# Altium footprint library Connector.PcbLib: 82 footprints (part 5 of 6)
Each footprint in its own frame and in the unit in brackets; x right, y up, seen from the top. Pads: shape width x height; smd on the part's side, far side on the other; paste and mask are expansions set on the pad; w line width, h text height; cw(c..) or ccw(c..) is an arc to the next point about the centre after c.
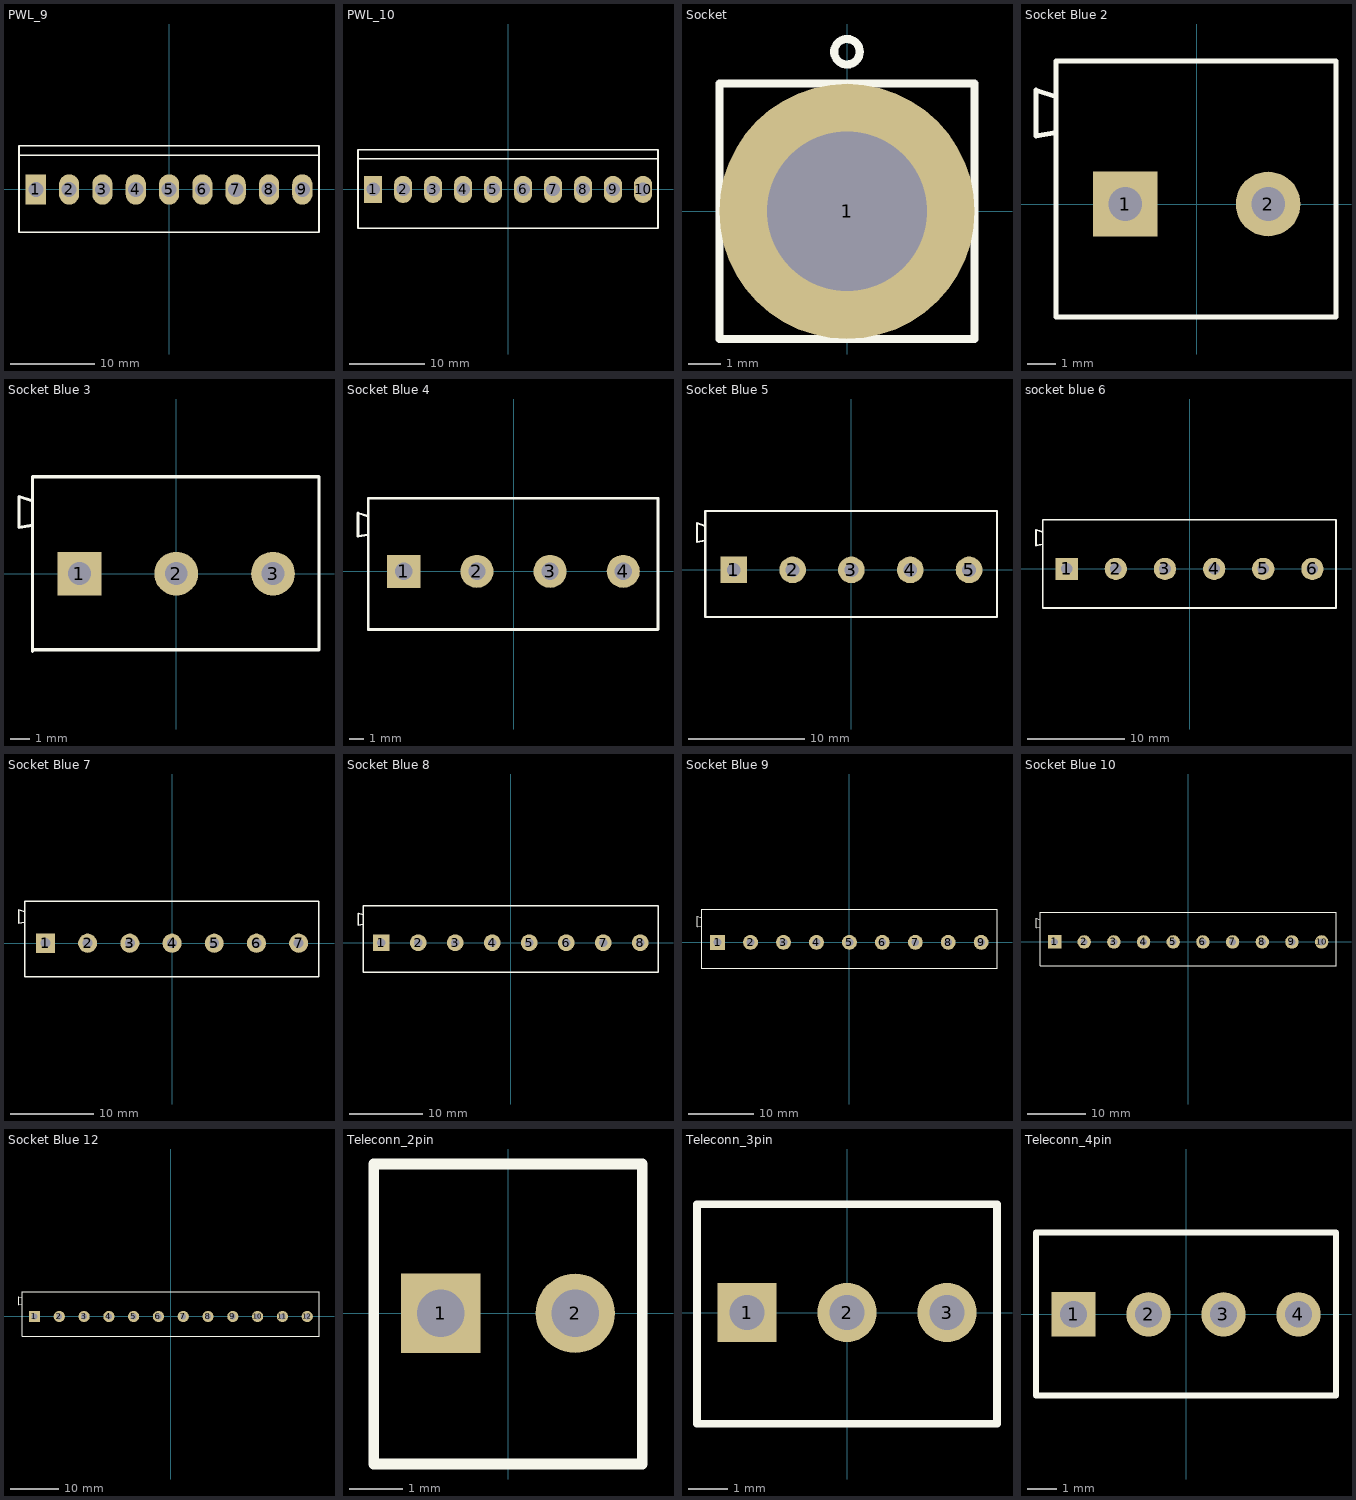
[diagram p4: the footprints below, top view; thin cyan lines are the x and y axes]

## PWL_9 [mm] "Connector; Header; 9 Position"
height 0.001
pads (9):
  rect 2.4x3.6 hole 1.8: 1(-15.84,0)
  oval 2.4x3.6 hole 1.8: 2(-11.88,0) 3(-7.92,0) 4(-3.96,0) 5(0,0) 6(3.96,0) 7(7.92,0) 8(11.88,0) 9(15.84,0)
Top Overlay:
  lines w0.2: -17.84,4.064 17.82,4.064 ; -17.84,-5.1 -17.84,5.207 17.82,5.207 17.82,-5.1 -17.84,-5.1
3D body "PWL-9.stp": height 13.5, standoff -4, extent -17.82,-5 17.82,5

## PWL_10 [mm] "Connector; Header; 10 Position"
height 0.001
pads (10):
  rect 2.4x3.6 hole 1.8: 1(-17.82,0)
  oval 2.4x3.6 hole 1.8: 2(-13.86,0) 3(-9.9,0) 4(-5.94,0) 5(-1.98,0) 6(1.98,0) 7(5.94,0) 8(9.9,0) 9(13.86,0) 10(17.82,0)
Top Overlay:
  lines w0.2: -19.82,4.064 19.8,4.064 ; -19.82,-5.1 19.8,-5.1 19.8,5.207 -19.82,5.207 -19.82,-5.1
3D body "PWL-10.stp": height 13.5, standoff -4, extent -19.8,-5 19.8,5

## Socket [mm]
pads (1):
  round 8 hole 5: 1(0,0)
Top Overlay:
  circle w0.254: c0,5 r0.4
  lines w0.254: -4,-4 -4,4 4,4 4,-4 -4,-4
3D body "New Socket-Short.STEP": height 26.7, standoff -4.75, extent -7.075,-7.075 7.075,7.075

## Socket Blue 2 [mm]
pads (2):
  rect 2.3x2.3 hole 1.2: 1(-2.54,0)
  round 2.3 hole 1.2: 2(2.54,0)
Top Overlay:
  lines w0.178: -5.004,2.54 -5.715,2.421 -5.715,4.047 -5.004,3.81 ; -5.004,-4.013 4.953,-4.013 4.953,5.08 -5.004,5.08 -5.004,-4.013
3D body "Socket Blue_2Pin.STEP": height 12.52, standoff -6.68, extent -5.777,-3.988 4.965,5.08

## Socket Blue 3 [mm]
pads (3):
  rect 2.3x2.3 hole 1.2: 1(-5.08,0)
  round 2.3 hole 1.2: 2(0,0) 3(5.08,0)
Top Overlay:
  lines w0.178: -7.544,2.54 -8.255,2.421 -8.255,4.047 -7.544,3.81 ; -7.544,-4.064 -7.544,-3.999 7.494,-3.999 7.494,5.08 -7.544,5.08 -7.544,-4.064
3D body "Socket Blue_3Pin.STEP": height 12.78, standoff -6.43, extent -8.328,-3.999 7.494,5.069

## Socket Blue 4 [mm]
pads (4):
  rect 2.3x2.3 hole 1.2: 1(-7.62,0)
  round 2.3 hole 1.2: 2(-2.54,0) 3(2.54,0) 4(7.62,0)
Top Overlay:
  lines w0.178: -10.084,2.54 -10.795,2.421 -10.795,4.047 -10.084,3.81 ; -10.084,-4.064 -10.084,-4.039 ; -10.084,-4.064 -10.084,-4.013 -10.084,-4.039 ; -10.084,-4.064 -10.084,5.08 10.031,5.08 10.031,-4.039 -10.084,-4.039
3D body "Socket Blue_4Pin.STEP": height 12.52, standoff -6.68, extent -10.871,-4.039 10.031,5.029

## Socket Blue 5 [mm]
pads (5):
  rect 2.3x2.3 hole 1.2: 1(-10.16,0)
  round 2.3 hole 1.2: 2(-5.08,0) 3(0,0) 4(5.08,0) 5(10.16,0)
Top Overlay:
  lines w0.178: -12.624,2.54 -13.335,2.421 -13.335,4.047 -12.624,3.81 ; -12.624,-4.064 -12.624,5.08 12.573,5.08 12.573,-4.064 -12.624,-4.064
3D body "Socket Blue_5Pin.STEP": height 12.52, standoff -6.68, extent -13.335,-4.026 12.647,5.042

## socket blue 6 [mm]
pads (6):
  rect 2.3x2.3 hole 1.2: 1(-12.7,0)
  round 2.3 hole 1.2: 2(-7.62,0) 3(-2.54,0) 4(2.54,0) 5(7.62,0) 6(12.7,0)
Top Overlay:
  lines w0.178: -15.164,-4.013 -15.164,-4.064 ; -15.164,2.54 -15.875,2.421 -15.875,4.047 -15.164,3.81 ; -15.164,-4.064 -15.164,-4.039 15.138,-4.039 15.138,5.08 -15.164,5.08 -15.164,-4.064
3D body "Socket Blue_6Pin.STEP": height 12.52, standoff -6.68, extent -15.924,-4.039 15.138,5.029

## Socket Blue 7 [mm]
pads (7):
  rect 2.3x2.3 hole 1.2: 1(-15.24,0)
  round 2.3 hole 1.2: 2(-10.16,0) 3(-5.08,0) 4(0,0) 5(5.08,0) 6(10.16,0) 7(15.24,0)
Top Overlay:
  lines w0.178: -17.704,-4.064 -17.704,5.08 17.685,5.08 17.685,-4.042 -17.704,-4.042 ; -17.704,2.54 -18.415,2.421 -18.415,4.047 -17.704,3.81
3D body "Socket Blue_7Pin.STEP": height 12.52, standoff -6.68, extent -18.457,-4.042 17.685,5.025

## Socket Blue 8 [mm]
pads (8):
  rect 2.3x2.3 hole 1.2: 1(-17.78,0)
  round 2.3 hole 1.2: 2(-12.7,0) 3(-7.62,0) 4(-2.54,0) 5(2.54,0) 6(7.62,0) 7(12.7,0) 8(17.78,0)
Top Overlay:
  lines w0.178: -20.244,-4.051 20.216,-4.051 20.216,5.08 -20.244,5.08 -20.244,-4.064 -20.244,-4.013 ; -20.244,2.54 -20.955,2.421 -20.955,4.047 -20.244,3.81
3D body "Socket Blue_8Pin.STEP": height 12.52, standoff -6.68, extent -21.006,-4.051 20.216,5.017

## Socket Blue 9 [mm]
pads (9):
  rect 2.3x2.3 hole 1.2: 1(-20.32,0)
  round 2.3 hole 1.2: 2(-15.24,0) 3(-10.16,0) 4(-5.08,0) 5(0,0) 6(5.08,0) 7(10.16,0) 8(15.24,0) 9(20.32,0)
Top Overlay:
  lines w0.178: -22.784,2.54 -23.495,2.421 -23.495,4.047 -22.784,3.81 ; -22.784,-4.064 -22.784,-4.013 22.758,-4.013 22.758,5.08 -22.784,5.08 -22.784,-4.064
3D body "Socket Blue_9Pin.STEP": height 12.52, standoff -6.68, extent -23.544,-4.013 22.758,5.055

## Socket Blue 10 [mm]
pads (10):
  rect 2.3x2.3 hole 1.2: 1(-22.86,0)
  round 2.3 hole 1.2: 2(-17.78,0) 3(-12.7,0) 4(-7.62,0) 5(-2.54,0) 6(2.54,0) 7(7.62,0) 8(12.7,0) 9(17.78,0) 10(22.86,0)
Top Overlay:
  lines w0.178: -25.324,2.54 -26.035,2.421 -26.035,4.047 -25.324,3.81 ; -25.324,-4.064 -25.324,5.08 25.324,5.08 25.324,-4.064 -25.324,-4.064
3D body "Socket Blue_10Pin.STEP": height 12.52, standoff -6.68, extent -26.086,-4.077 25.298,4.991

## Socket Blue 12 [mm]
pads (12):
  rect 2.3x2.3 hole 1.2: 1(-27.94,0)
  round 2.3 hole 1.2: 2(-22.86,0) 3(-17.78,0) 4(-12.7,0) 5(-7.62,0) 6(-2.54,0) 7(2.54,0) 8(7.62,0) 9(12.7,0) 10(17.78,0) 11(22.86,0) 12(27.94,0)
Top Overlay:
  lines w0.178: -30.404,2.54 -31.115,2.421 -31.115,4.047 -30.404,3.81 ; -30.404,-4.064 -30.404,5.08 30.36,5.08 30.36,-4.064 -30.404,-4.064
3D body "Socket Blue_12Pin.STEP": height 12.52, standoff -6.69, extent -31.146,-4.034 30.36,5.034

## Teleconn_2pin [mm]
pads (2):
  rect 1.5x1.5 hole 0.9: 1(-1.27,0)
  round 1.5 hole 0.9: 2(1.27,0)
Top Overlay:
  lines w0.2: -2.54,-2.85 2.54,-2.85 2.54,2.825 -2.54,2.825 -2.54,-2.85
3D body "2 Pin.STEP": height 11.7, standoff -3.54, extent -2.54,-2.942 2.54,2.9

## Teleconn_3pin [mm] ")"
pads (3):
  rect 1.5x1.5 hole 0.9: 1(-2.54,0)
  round 1.5 hole 0.9: 2(0,0) 3(2.54,0)
Top Overlay:
  lines w0.2: -3.81,-2.825 3.81,-2.825 3.81,2.75 -3.81,2.75 -3.81,-2.825
3D body "3 Pin.STEP": height 11.7, standoff -3.54, extent -3.81,-2.967 3.81,2.875

## Teleconn_4pin [mm]
pads (4):
  rect 1.5x1.5 hole 0.9: 1(-3.81,0)
  round 1.5 hole 0.9: 2(-1.27,0) 3(1.27,0) 4(3.81,0)
Top Overlay:
  lines w0.2: -5.08,-2.75 -5.08,2.775 5.08,2.775 5.08,-2.75 -5.08,-2.75
3D body "4 Pin.STEP": height 11.7, standoff -3.54, extent -5.08,-2.921 5.08,2.921